# Altium footprint library Connectors.PcbLib: 122 footprints (part 1 of 8)
Each footprint in its own frame and in the unit in brackets; x right, y up, seen from the top. Pads: shape width x height; smd on the part's side, far side on the other; paste and mask are expansions set on the pad; w line width, h text height; cw(c..) or ccw(c..) is an arc to the next point about the centre after c.
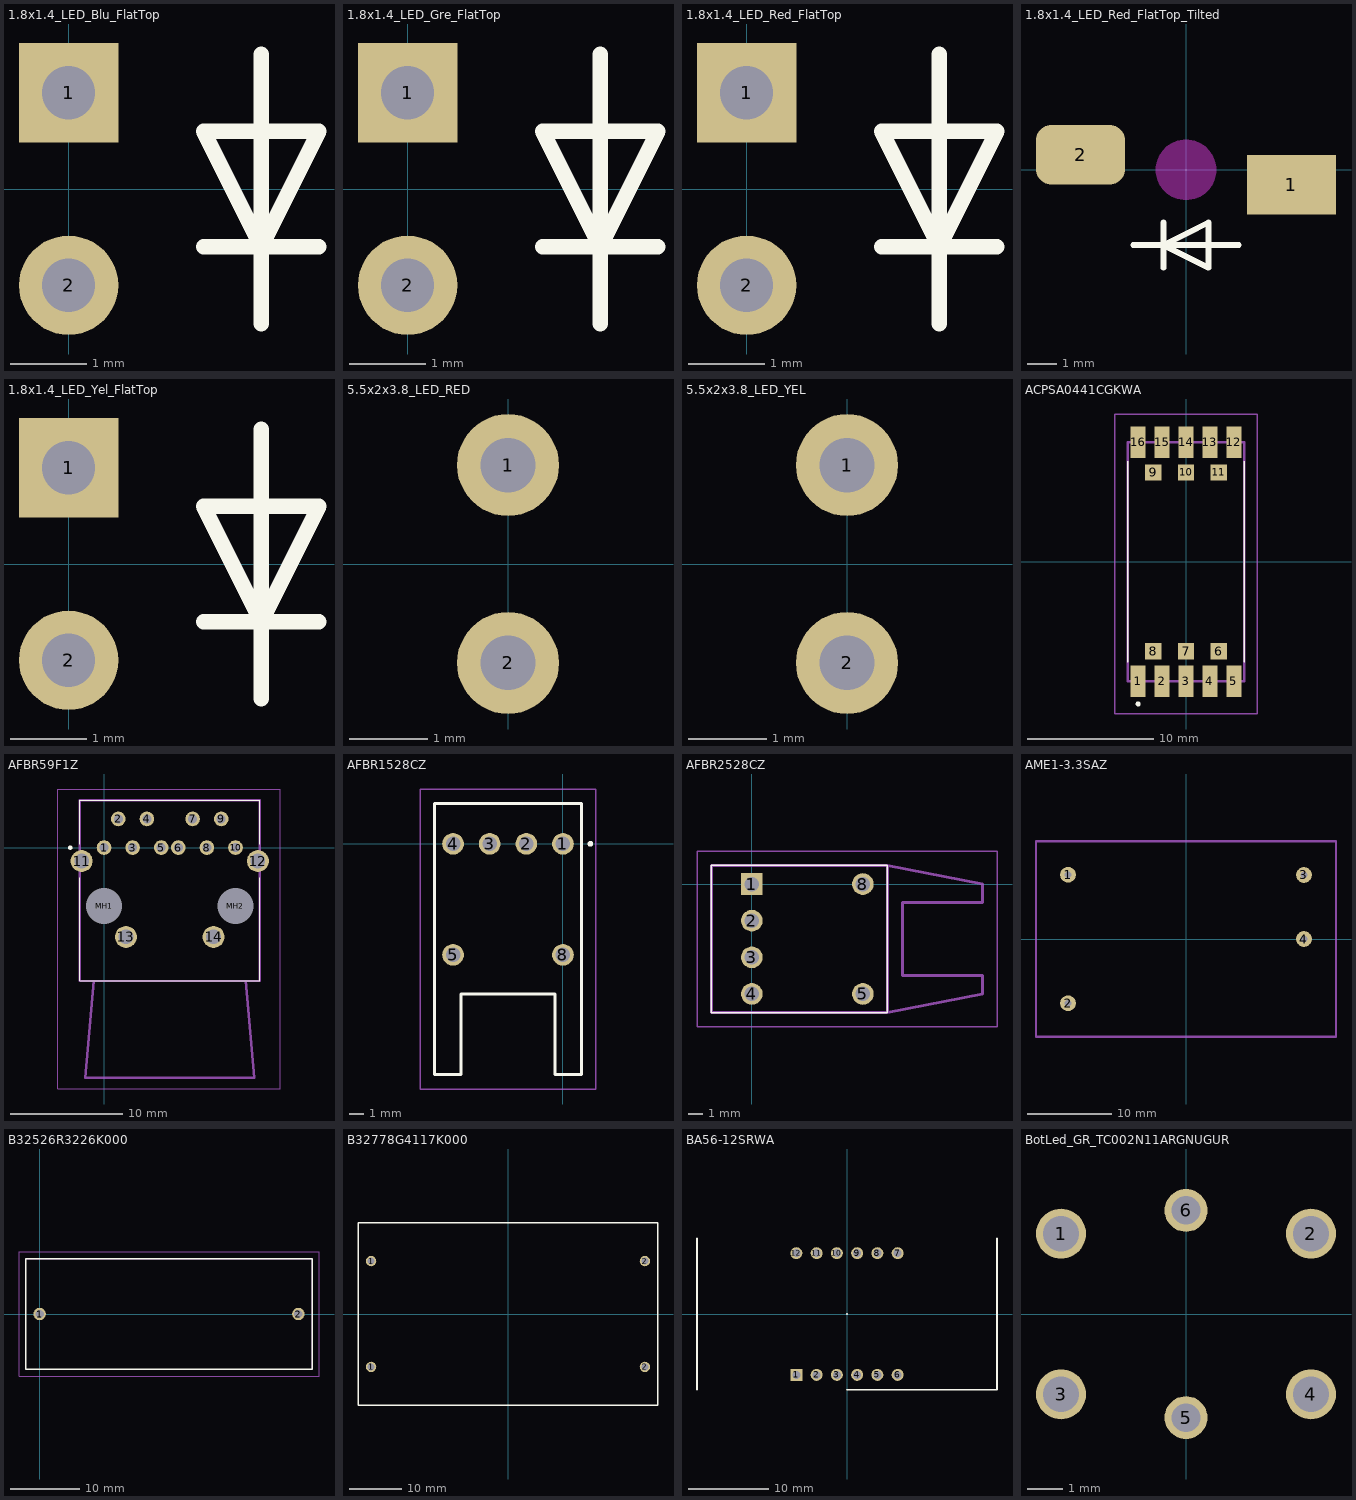
[diagram p0: the footprints below, top view; thin cyan lines are the x and y axes]

## 1.8x1.4_LED_Blu_FlatTop [mm]
pads (2):
  rect 1.31x1.31 hole 0.7: 1(0,1.27)
  round 1.31 hole 0.7: 2(0,-1.27)
Top Overlay:
  lines w0.2: 1.778,-0.762 3.302,-0.762 ; 2.54,-1.778 2.54,1.778 ; 1.778,0.762 3.302,0.762 2.54,-0.762 1.778,0.762
3D body "BL-L189UBC.STEP": height 11, standoff -17.76, extent -1.2,-1.65 1.2,1.65

## 1.8x1.4_LED_Gre_FlatTop [mm]
pads (2):
  rect 1.31x1.31 hole 0.7: 1(0,1.27)
  round 1.31 hole 0.7: 2(0,-1.27)
Top Overlay:
  lines w0.2: 1.778,-0.762 3.302,-0.762 ; 2.54,-1.778 2.54,1.778 ; 1.778,0.762 3.302,0.762 2.54,-0.762 1.778,0.762
3D body "BL-L189PGS.STEP": height 11, standoff -17.76, extent -1.2,-1.65 1.2,1.65

## 1.8x1.4_LED_Red_FlatTop [mm]
pads (2):
  rect 1.31x1.31 hole 0.7: 1(0,1.27)
  round 1.31 hole 0.7: 2(0,-1.27)
Top Overlay:
  lines w0.2: 1.778,-0.762 3.302,-0.762 ; 2.54,-1.778 2.54,1.778 ; 1.778,0.762 2.54,-0.762 3.302,0.762 1.778,0.762
3D body "BL-L189URC.STEP": height 11, standoff -17.76, extent -1.2,-1.65 1.2,1.65

## 1.8x1.4_LED_Red_FlatTop_Tilted [mm]
pads (2):
  rect 3x2 smd: 1(3.556,-0.508)
  rrect50% 3x2 smd: 2(-3.556,0.508)
Top Overlay:
  lines w0.2: -1.778,-2.54 1.778,-2.54 ; -0.762,-3.302 -0.762,-1.778 ; -0.762,-2.54 0.762,-3.302 0.762,-1.778 -0.762,-2.54
Keep-Out Layer:
  board cut-out: -1.016,0 -1.016,0.1 -0.977,0.296 -0.9,0.481 -0.789,0.648 -0.648,0.789 -0.481,0.9 -0.296,0.977 -0.1,1.016 0,1.016 0.1,1.016 0.296,0.977 0.481,0.9 0.648,0.789 0.789,0.648 0.9,0.481 0.977,0.296 1.016,0.1 1.016,0 1.016,-0.1 0.977,-0.296 0.9,-0.481 0.789,-0.648 0.648,-0.789 0.481,-0.9 0.296,-0.977 0.1,-1.016 0,-1.016 -0.1,-1.016 -0.296,-0.977 -0.481,-0.9 -0.648,-0.789 -0.789,-0.648 -0.9,-0.481 -0.977,-0.296 -1.016,-0.1
3D body "BL-L189URC_Tlt.STEP": height 0.5, standoff -7, extent -5.25,-1.65 5.25,1.65

## 1.8x1.4_LED_Yel_FlatTop [mm]
pads (2):
  rect 1.31x1.31 hole 0.7: 1(0,1.27)
  round 1.31 hole 0.7: 2(0,-1.27)
Top Overlay:
  lines w0.2: 1.778,-0.762 3.302,-0.762 ; 2.54,-1.778 2.54,1.778 ; 1.778,0.762 3.302,0.762 2.54,-0.762 1.778,0.762
3D body "BL-L189UYC.STEP": height 11, standoff -17.76, extent -1.2,-1.65 1.2,1.65

## 5.5x2x3.8_LED_RED [mm] "2mm FLAT TOP LED LAMP"
pads (2):
  round 1.31 hole 0.7: 1(0,1.27) 2(0,-1.27)
3D body "L-1394IDT.STEP": height 14, standoff -19, extent -1.5,-1.884 1.5,1.884

## 5.5x2x3.8_LED_YEL [mm] "2mm FLAT TOP LED LAMP"
pads (2):
  round 1.31 hole 0.7: 1(0,1.27) 2(0,-1.27)
3D body "L-1394YDT.STEP": height 14, standoff -19, extent -1.5,-1.884 1.5,1.884

## ACPSA0441CGKWA [mm]
pads (16):
  rect 1.2x2.5 smd: 1(-3.8,-9.5) 2(-1.9,-9.5) 3(0,-9.5) 4(1.9,-9.5) 5(3.8,-9.5) 12(3.8,9.5) 13(1.9,9.5) 14(0,9.5) 15(-1.9,9.5) 16(-3.8,9.5)
  rect 1.3x1.3 smd: 6(2.6,-7.1) 7(0,-7.1) 8(-2.6,-7.1) 9(-2.6,7.1) 10(0,7.1) 11(2.6,7.1)
Top Overlay:
  lines w0.1: -4.65,-8 -4.65,-0.2 -4.65,8 ; 4.65,-8 4.65,-0.8 ; 4.65,-1 4.65,8
  lines w0.2: -3.8,-11.4 ccw(c-3.8,-11.3) -3.8,-11.2 ccw(c-3.8,-11.3) -3.8,-11.4
Mechanical 13:
  lines w0.2: -4.65,-9.5 -4.65,9.5 4.65,9.5 4.65,-9.5 -4.65,-9.5
Mechanical 15:
  lines w0.1: -5.65,-12.1 -5.65,11.75 5.65,11.75 5.65,-12.1 -5.65,-12.1
3D body "ACPSA04-41CGKWA.stp": height 4.1, standoff 0, extent -4.65,-10.63 4.65,10.63

## AFBR59F1Z [mm]
pads (16):
  round 1.3 hole 0.8: 1(0,0) 2(1.27,2.54) 3(2.54,0) 4(3.81,2.54) 5(5.08,0) 6(6.6,0) 7(7.87,2.54) 8(9.14,0) 9(10.41,2.54) 10(11.68,0)
  round 1.95 hole 1.3: 11(-1.99,-1.2) 12(13.67,-1.2) 13(1.95,-7.94) 14(9.73,-7.94)
  round 1.6 hole 3.2 unplated: MH1(0.01,-5.2) MH2(11.67,-5.2)
Top Overlay:
  lines w0.1: -2.16,-2.7 -2.16,-11.7 -2.16,-11.85 13.34,-11.85 13.84,-11.85 13.84,-2.7 ; -2.16,0.3 -2.16,4.2 13.84,4.2 13.84,0.3
  lines w0.2: -3,-0.1 cw(c-3,0) -3,0.1 cw(c-3,0) -3,-0.1
Mechanical 13:
  lines w0.2: -0.91,-11.85 -1.66,-20.45 13.34,-20.45 12.59,-11.85 ; -2.16,-11.85 13.84,-11.85 13.84,4.2 -2.16,4.2 -2.16,-11.85
Mechanical 15:
  lines w0.1: -4.1,-21.45 15.645,-21.45 15.645,5.2 -4.1,5.2 -4.1,-21.45

## AFBR1528CZ [mm]
pads (6):
  round 1.5 hole 1: 1(0,0) 2(-2.54,0) 3(-5.08,0) 4(-7.62,0) 5(-7.62,-7.7) 8(0,-7.7)
Top Overlay:
  lines w0.2: -8.91,-16 -8.91,2.8 ; -8.91,-16 -8.91,2.8 ; -8.91,-16 -7.06,-16 ; -8.91,-16 -7.06,-16 ; -8.91,2.8 1.29,2.8 ; -8.91,2.8 1.29,2.8 ; -7.06,-16 -7.06,-10.4 ; -7.06,-16 -7.06,-10.4 ; -7.06,-10.4 -0.56,-10.4 ; -7.06,-10.4 -0.56,-10.4 ; -0.56,-16 -0.56,-10.4 ; -0.56,-16 -0.56,-10.4 ; -0.56,-16 1.29,-16 ; -0.56,-16 1.29,-16 ; 1.29,-16 1.29,2.8 ; 1.29,-16 1.29,2.8 ; 1.8,0 ccw(c1.9,0) 2,0 ; 1.8,0 cw(c1.9,0) 2,0 ; 1.8,0 ccw(c1.9,0) 2,0
Mechanical 13:
  lines w0.1: -8.91,-16 -8.91,2.8 ; -8.91,-16 -8.91,2.8 ; -8.91,-16 -7.06,-16 ; -8.91,-16 -7.06,-16 ; -8.91,2.8 1.29,2.8 ; -8.91,2.8 1.29,2.8 ; -7.06,-16 -7.06,-10.4 ; -7.06,-16 -7.06,-10.4 ; -7.06,-10.4 -0.56,-10.4 ; -7.06,-10.4 -0.56,-10.4 ; -0.56,-16 -0.56,-10.4 ; -0.56,-16 -0.56,-10.4 ; -0.56,-16 1.29,-16 ; -0.56,-16 1.29,-16 ; 1.29,-16 1.29,2.8 ; 1.29,-16 1.29,2.8
Mechanical 15:
  lines w0.1: -9.91,-17 -9.91,3.8 2.29,3.8 2.29,-17 -9.91,-17
3D body "AFBR-1528CZ.stp": height 7.7, standoff -5, extent -8.91,-8.099 1.29,2.8

## AFBR2528CZ [mm]
pads (6):
  rect 1.5x1.5 hole 1: 1(0,0)
  round 1.5 hole 1: 2(0,-2.54) 3(0,-5.08) 4(0,-7.62) 5(7.7,-7.62) 8(7.7,0)
Top Overlay:
  lines w0.1: -2.8,-8.91 -2.8,1.29 9.4,1.29 9.4,-8.91 -2.8,-8.91
Mechanical 13:
  lines w0.2: 9.4,-8.91 16,-7.62 16,-6.35 12.44,-6.35 10.44,-6.35 10.44,-1.27 16,-1.27 16,0 9.4,1.29 ; 9.4,-8.91 -2.8,-8.91 -2.8,1.29 9.4,1.29 ; 9.4,-8.91 9.4,1.29
Mechanical 15:
  lines w0.1: -3.8,-9.91 -3.8,2.29 17,2.29 17,-9.91 -3.8,-9.91

## AME1-3.3SAZ [mm] "AC/DC, 1W, 3.3V/0.3A"
height 19.32
pads (4):
  round 1.89 hole 0.8: 1(-14,7.62) 2(-14,-7.62) 3(14,7.6) 4(14,0)
Bottom Overlay:
  circle w0.4: c-14,6 r0.226
  text "N" at -10,6.5 h2
  text "~220V" at -7,-1 h2
  text "Line" at -5,-8.5 h2
  text "V-" at 12,6.5 h2
  text "V+" at 12,-1 h2
Mechanical 13:
  lines w0.254: -17.8,-11.605 -17.8,11.605 ; -17.8,-11.605 17.8,-11.605 ; -17.8,-11.605 17.8,-11.605 ; -17.8,-11.605 -17.8,11.605 ; -17.8,-11.605 -17.8,11.605 ; -17.8,-11.605 17.8,-11.605 ; -17.8,11.605 17.8,11.605 ; -17.8,11.605 17.8,11.605 ; -17.8,11.605 17.8,11.605 ; 17.8,-11.605 17.8,11.605 ; 17.8,-11.605 17.8,11.605 ; 17.8,-11.605 17.8,11.605
3D body: height 1.1, standoff -3, extent -14.3,7.3 -13.7,7.9
3D body: height 1.1, standoff -3, extent -14.3,-7.9 -13.7,-7.3
3D body: height 1.1, standoff -3, extent 13.7,-0.3 14.3,0.3
3D body: height 1.1, standoff -3, extent 13.7,7.3 14.3,7.9
3D body: height 0.25, standoff 0, extent 12.7,9.5 12.7,9.5
3D body: height 4.1, standoff -2, extent -14,7.6 -14,7.6
3D body: height 19.32, standoff 2, extent -17.8,-11.6 17.8,11.6

## B32526R3226K000 [mm]
pads (2):
  round 1.8 hole 1.2: 1(0,0) 2(37.5,0)
Top Overlay:
  lines w0.2: -2,-8 -2,8 39.5,8 39.5,-8 -2,-8
Bottom Overlay:
  lines w0.2: -2,-8 -2,8 39.5,8 39.5,-8 -2,-8
Mechanical 13:
  lines w0.1: -2,-8 -2,8 39.5,8 39.5,-8 -2,-8
Mechanical 15:
  lines w0.1: -3,-9 -3,9 40.5,9 40.5,-9 -3,-9
3D body "B32526R3226K000.stp": height 28.6, standoff -5, extent -2,-8 39.5,8

## B32778G4117K000 [mm] "110 uF, 450 V"
height 50
pads (5):
  round 2 hole 1.3: 1(-26.25,-10.15) 1(-26.25,-10.15) 1(-26.25,10.15) 2(26.25,-10.15) 2(26.25,10.15)
Top Overlay:
  lines w0.254: -28.75,-17.5 28.75,-17.5 28.75,17.5 -28.75,17.5 -28.75,-17.5
Bottom Overlay:
  lines w0.254: -28.75,-17.5 28.75,-17.5 28.75,17.5 -28.75,17.5 -28.75,-17.5
3D body: height 0, standoff -6, extent -26.85,-10.75 -25.65,-9.55
3D body: height 0, standoff -6, extent 25.65,-10.75 26.85,-9.55
3D body: height 0, standoff -6, extent 25.65,9.55 26.85,10.75
3D body: height 0, standoff -6, extent -26.85,9.55 -25.65,10.75
3D body: height 50, standoff 0, extent -28.75,-17.5 28.75,17.5

## BA56-12SRWA [mm] "Индикатор 14.2мм 3х7 красный ОК, 24мКд"
height 8.1
pads (12):
  rect 1.5x1.5 hole 1: 1(-6.35,-7.62)
  round 1.5 hole 1: 2(-3.81,-7.62) 3(-1.27,-7.62) 4(1.27,-7.62) 5(3.81,-7.62) 6(6.35,-7.62) 7(6.35,7.62) 8(3.81,7.62) 9(1.27,7.62) 10(-1.27,7.62) 11(-3.81,7.62) 12(-6.35,7.62)
Top Overlay:
  lines w0.2: -18.796,-9.5 -18.796,9.5 ; 0,-9.5 18.796,-9.5 18.796,9.5
  lines w0.254: 0,-0.01 0,0.01
3D body: height 0.25, standoff 0, extent -2.75,8.75 -2.75,8.75
3D body "BA56-12SRWA.STEP": height 10.1, standoff 0.5, extent -18.8,-9.5 18.8,9.5

## BotLed_GR_TC002N11ARGNUGUR [mm]
pads (6):
  round 1.401 hole 1: 1(-3.5,2.25) 2(3.5,2.25) 3(-3.5,-2.25) 4(3.5,-2.25)
  round 1.201 hole 0.8: 5(0,-2.9) 6(0,2.9)
3D body "TC002N11ARGNUGUR.STEP": height 7.7, standoff -3.5, extent -5,-5 5,5